# Altium footprint library UAARG Autopilot.PcbLib: 95 footprints (part 4 of 6)
Each footprint in its own frame and in the unit in brackets; x right, y up, seen from the top. Pads: shape width x height; smd on the part's side, far side on the other; paste and mask are expansions set on the pad; w line width, h text height; cw(c..) or ccw(c..) is an arc to the next point about the centre after c.
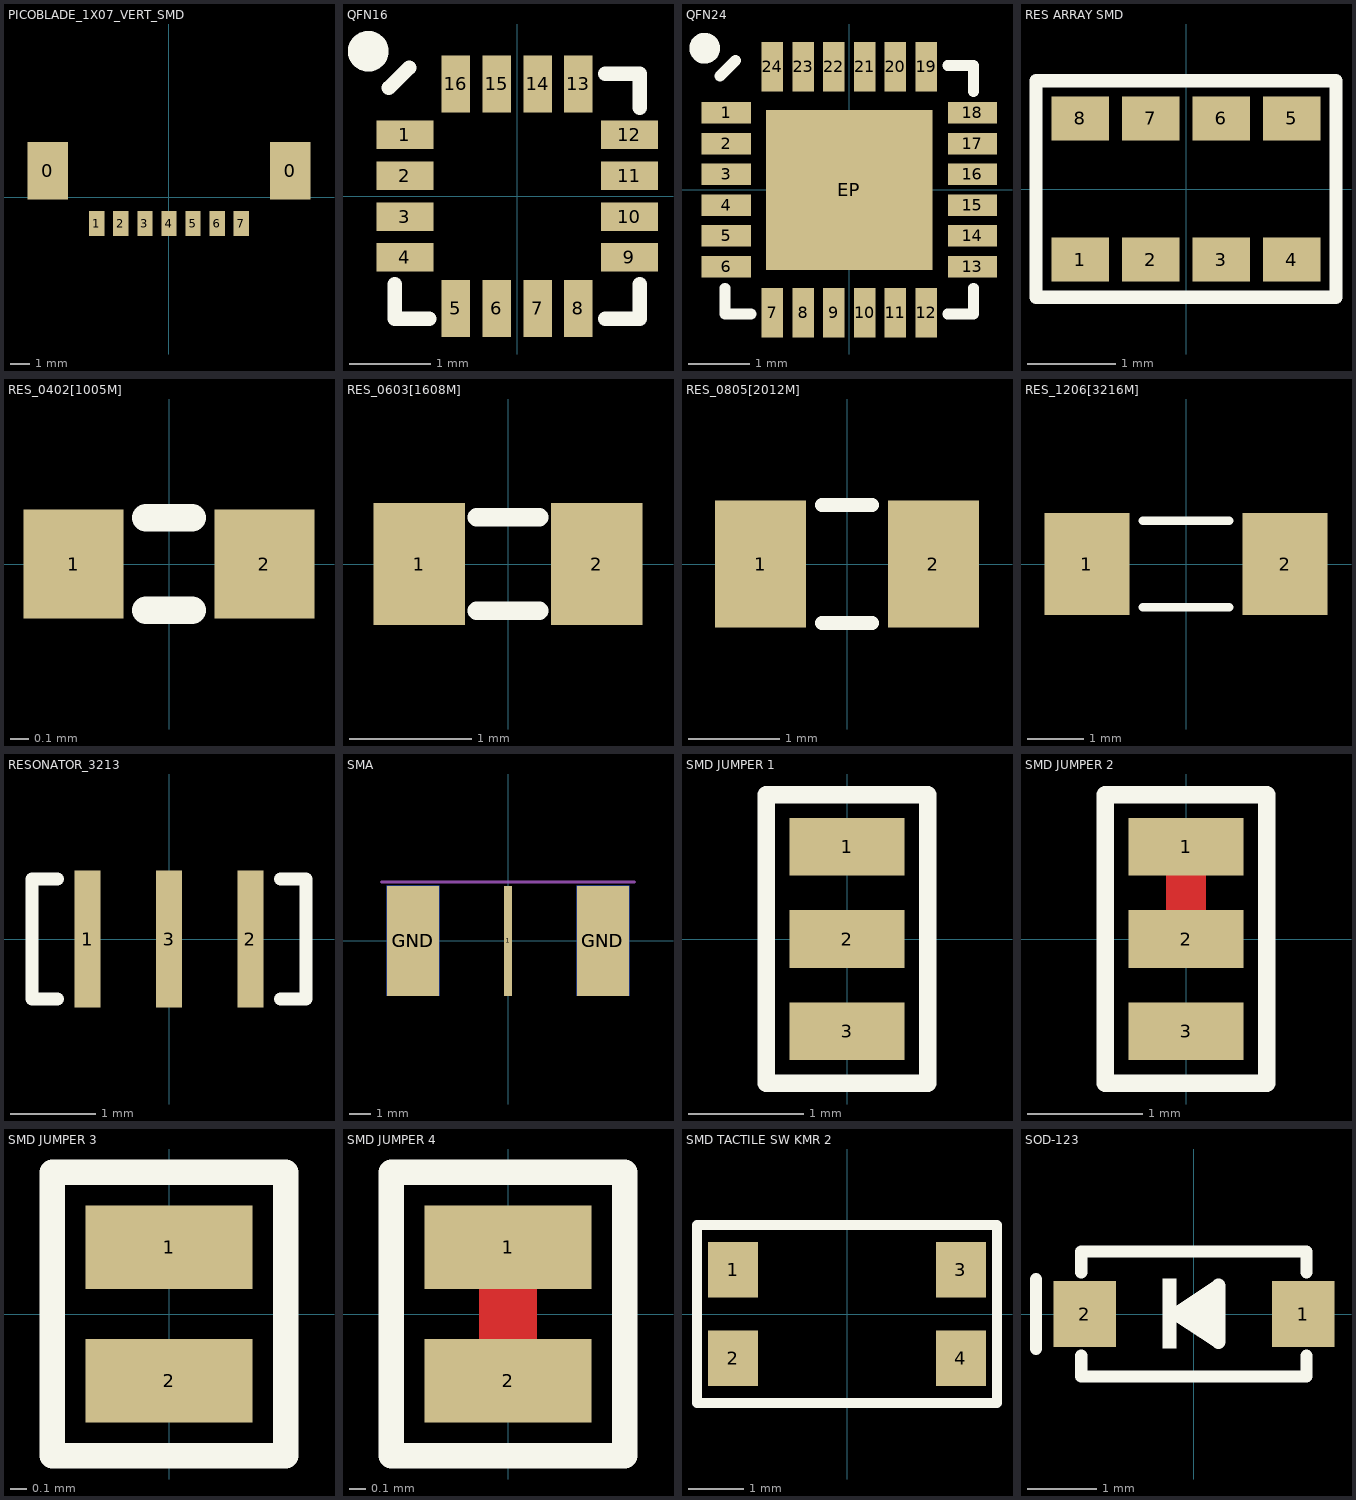
[diagram p3: the footprints below, top view; thin cyan lines are the x and y axes]

## PICOBLADE_1X07_VERT_SMD [mm] "PicoBlade connector 1x07, vertical, smd, 1.25mm pitch"
height 4.7
pads (9):
  rect 2.1x3 smd: 0(-6.3,1.375) 0(6.3,1.375)
  rect 0.8x1.3 smd: 1(-3.75,-1.375) 2(-2.5,-1.375) 3(-1.25,-1.375) 4(0,-1.375) 5(1.25,-1.375) 6(2.5,-1.375) 7(3.75,-1.375)
3D body: height 4.7, standoff 0, extent -6.95,-1.728 6.95,2.472

## QFN16 [mm] "QFN, 16-Leads, Body 3x3mm, Pitch 0.5mm"
height 0.9
pads (16):
  rect 0.7x0.35 smd mask+0.03: 1(-1.375,0.75) 2(-1.375,0.25) 3(-1.375,-0.25) 4(-1.375,-0.75) 9(1.375,-0.75) 10(1.375,-0.25) 11(1.375,0.25) 12(1.375,0.75)
  rect 0.35x0.7 smd mask+0.03: 5(-0.75,-1.375) 6(-0.25,-1.375) 7(0.25,-1.375) 8(0.75,-1.375) 13(0.75,1.375) 14(0.25,1.375) 15(-0.25,1.375) 16(-0.75,1.375)
Top Overlay:
  circle w0.25: c-1.825,1.775 r0.125
  lines w0.178: -1.575,1.325 -1.325,1.575 ; -1.5,-1.08 -1.5,-1.5 -1.08,-1.5 ; 1.08,1.5 1.5,1.5 1.5,1.08 ; 1.08,-1.5 1.5,-1.5 1.5,-1.08
3D body: height 0.92, standoff 0, extent -1.5,-1.5 1.5,1.5

## QFN24 [mm] "QFN, 24-Leads, Body 4x4mm, Pitch 0.5mm"
height 0.9
pads (25):
  rect 0.8x0.35 smd mask+0.03: 1(-2,1.25) 2(-2,0.75) 3(-2,0.25) 4(-2,-0.25) 5(-2,-0.75) 6(-2,-1.25) 13(2,-1.25) 14(2,-0.75) 15(2,-0.25) 16(2,0.25) 17(2,0.75) 18(2,1.25)
  rect 0.35x0.8 smd mask+0.03: 7(-1.25,-2) 8(-0.75,-2) 9(-0.25,-2) 10(0.25,-2) 11(0.75,-2) 12(1.25,-2) 19(1.25,2) 20(0.75,2) 21(0.25,2) 22(-0.25,2) 23(-0.75,2) 24(-1.25,2)
  rect 2.7x2.6 smd: EP(0,0)
Top Overlay:
  circle w0.25: c-2.35,2.3 r0.125
  lines w0.178: -2.1,1.85 -1.85,2.1 ; -2.02,-1.6 -2.02,-2.02 -1.6,-2.02 ; 1.6,-2.02 2.02,-2.02 2.02,-1.6 ; 1.6,2.02 2.02,2.02 2.02,1.6
3D body: height 0.9, standoff 0, extent -2.02,-2.02 2.02,2.02

## RES ARRAY SMD [mm] "SMD Resistor Array (Network) 4 resistors"
height 0.6
pads (8):
  rect 0.65x0.5 smd: 1(-1.2,-0.8) 2(-0.4,-0.8) 3(0.4,-0.8) 4(1.2,-0.8) 5(1.2,0.8) 6(0.4,0.8) 7(-0.4,0.8) 8(-1.2,0.8)
Top Overlay:
  lines w0.152: -1.7,-1.225 -1.7,1.225 1.7,1.225 1.7,-1.225 -1.7,-1.225
3D body: height 0.55, standoff 0, extent -1.6,-0.8 1.6,0.8

## RES_0402[1005M] [mm] "Chip SMD Resistor Body 1.0x0.5mm, IPC Low Density"
height 0.4
pads (2):
  rect 0.55x0.6 smd: 1(-0.525,0) 2(0.525,0)
Top Overlay:
  lines w0.152: -0.127,-0.254 0.127,-0.254 ; -0.127,0.254 0.127,0.254
3D body: height 0.34, standoff -0.01, extent -0.5,-0.25 0.5,0.25

## RES_0603[1608M] [mm] "Chip SMD Resistor Body 1.6x0.8mm, IPC Low Density"
height 0.6
pads (2):
  rect 0.75x1 smd: 1(-0.725,0) 2(0.725,0)
Top Overlay:
  lines w0.152: -0.254,-0.381 0.254,-0.381 ; -0.254,0.381 0.254,0.381
3D body: height 0.44, standoff -0.01, extent -0.8,-0.4 0.8,0.4

## RES_0805[2012M] [mm] "Chip SMD Resistor Body 2.0x1.2mm, IPC Low Density"
height 0.65
pads (2):
  rect 1x1.4 smd: 1(-0.95,0) 2(0.95,0)
Top Overlay:
  lines w0.152: -0.275,-0.65 0.275,-0.65 ; -0.275,0.65 0.275,0.65
3D body: height 0.59, standoff -0.01, extent -1,-0.625 1,0.625

## RES_1206[3216M] [mm] "Chip SMD Resistor Body 3.2x1.6mm, IPC Low Density"
height 0.71
pads (2):
  rect 1.5x1.8 smd: 1(-1.75,0) 2(1.75,0)
Top Overlay:
  lines w0.152: -0.762,-0.762 0.762,-0.762 ; -0.762,0.762 0.762,0.762
3D body: height 0.59, standoff -0.01, extent -1.6,-0.8 1.6,0.8

## RESONATOR_3213 [mm] "SMD Resonator  (3.20mm x 1.30mm)"
height 1
pads (3):
  rect 0.3x1.6 smd: 1(-0.95,0) 2(0.95,0) 3(0,0)
Top Overlay:
  lines w0.152: -1.3,-0.7 -1.6,-0.7 -1.6,0.7 -1.3,0.7 ; 1.3,-0.7 1.6,-0.7 1.6,0.7 1.3,0.7
3D body: height 1.01, standoff -0.11, extent -1.6,-0.65 1.6,0.65

## SMA [mil] "Jhonson 142-0701-801 SMA edge-mount connector"
height 131
pads (5):
  rect 15x200 smd paste-200: 1(0,0)
  rect 95x200 smd paste-200: GND(-172.5,0) GND(172.5,0)
  rect 95x200 smd far side paste-200: GND(-172.5,0) GND(172.5,0)
Mechanical 1:
  lines w5: -230,107 230,107
3D body: height 170.87, standoff -140.94, extent -187.39,-80 187.41,481.81

## SMD JUMPER 1 [mm] "Solder Jumper SMD SPDT NO"
pads (3):
  rect 1x0.5 smd paste-1: 1(0,0.8) 2(0,0) 3(0,-0.8)
Top Overlay:
  lines w0.152: -0.7,-1.25 0.7,-1.25 0.7,1.25 -0.7,1.25 -0.7,-1.25

## SMD JUMPER 2 [mm] "Solder Jumper SMD SPDT NC"
pads (3):
  rect 1x0.5 smd paste-1: 1(0,0.8) 2(0,0) 3(0,-0.8)
Top Layer:
  rectangle: -0.175,0 0.175,0.8
Top Overlay:
  lines w0.152: -0.7,-1.25 0.7,-1.25 0.7,1.25 -0.7,1.25 -0.7,-1.25

## SMD JUMPER 3 [mm] "Solder Jumper SMD SPST NO"
pads (2):
  rect 1x0.5 smd paste-1: 1(0,0.4) 2(0,-0.4)
Top Overlay:
  lines w0.152: -0.7,-0.85 0.7,-0.85 0.7,0.85 -0.7,0.85 -0.7,-0.85

## SMD JUMPER 4 [mm] "Solder Jumper SMD SPST NC"
pads (2):
  rect 1x0.5 smd paste-1: 1(0,0.4) 2(0,-0.4)
Top Layer:
  rectangle: -0.175,-0.4 0.175,0.4
Top Overlay:
  lines w0.152: -0.7,-0.85 -0.7,0.85 0.7,0.85 0.7,-0.85 -0.7,-0.85

## SMD TACTILE SW KMR 2 [mm] "C&K Components - KMR 2 Series"
height 1.9
pads (4):
  rect 0.9x1 smd: 1(-2.05,0.8) 2(-2.05,-0.8) 3(2.05,0.8) 4(2.05,-0.8)
Top Overlay:
  lines w0.178: -2.7,-1.6 -2.7,1.6 2.7,1.6 2.7,-1.6 -2.7,-1.6
3D body: height 2.1, standoff 0, extent -2.3,-1.5 2.3,1.5

## SOD-123 [mm] "SOD-123 SMD"
height 1.45
pads (2):
  rect 0.9x0.95 smd: 1(1.575,0) 2(-1.575,0)
Top Overlay:
  rectangle: -0.451,-0.5 -0.251,0.508
  region: -0.1,0 0.3,0.268 0.3,-0.263
  lines w0.178: -2.275,-0.5 -2.275,0.5 ; -1.625,-0.6 -1.625,-0.9 1.625,-0.9 1.625,-0.6 ; -1.625,0.6 -1.625,0.9 1.625,0.9 1.625,0.6
  lines w0.203: -0.25,0 0.356,0.407 0.356,-0.4 -0.25,0
3D body: height 1.45, standoff 0, extent -1.925,-0.85 1.925,0.85